# Altium schematic symbol library jlcpcb_2025_04_ferrites_extended_0603.schlib: 833 symbols (part 3 of 4) (continued)
## MMZ1608B301CTDH5
designator FB?  Impedance @ Frequency: 300Ω@100MHz
Ferrite, 300Ω@100MHz, ±25%, 250mΩ, 500mA, SMD 0603; Manufacturer: TDK; Manufacturer Part Number: MMZ1608B301CTDH5; Package Size: 0603; JLCPCB Basic Part: No; JLCPCB Part Number: C433027; Supplier 1: LCSC; Category: Ferrite Beads; Supplier Part Number 1: C433027; Tolerance: ±25%; Rated Current: 500mA; DC Resistance: 250mΩ; RoHS: Yes; ComponentLink1Description: Datasheet; ComponentLink1URL: https://wmsc.lcsc.com/wmsc/upload/file/pdf/v2/lcsc/2304140030_TDK-MMZ1608B301CTDH5_C433027.pdf; ComponentLink2Description: JLCPCB Part URL; ComponentLink2URL: https://jlcpcb.com/partdetail/C433027; ComponentLink3Description: LCSC Part URL; ComponentLink3URL: https://lcsc.com/product-detail/Ferrite-Beads_TDK-TDK-MMZ1608B301CTDH5_C433027.html
footprint FB-0603 (0603 (1608M) Ferrite)
pins: 1, 2

## MMZ1608B471CTAH0
designator FB?  Impedance @ Frequency: 470Ω@100MHz
Ferrite, 470Ω@100MHz, ±25%, 300mΩ, 500mA, SMD 0603; Manufacturer: TDK; Manufacturer Part Number: MMZ1608B471CTAH0; Package Size: 0603; JLCPCB Basic Part: No; JLCPCB Part Number: C2661479; Supplier 1: LCSC; Category: Ferrite Beads; Supplier Part Number 1: C2661479; Tolerance: ±25%; Rated Current: 500mA; DC Resistance: 300mΩ; RoHS: Yes; ComponentLink1Description: Datasheet; ComponentLink1URL: https://wmsc.lcsc.com/wmsc/upload/file/pdf/v2/lcsc/2304140030_TDK-MMZ1608B471CTAH0_C2661479.pdf; ComponentLink2Description: JLCPCB Part URL; ComponentLink2URL: https://jlcpcb.com/partdetail/C2661479; ComponentLink3Description: LCSC Part URL; ComponentLink3URL: https://lcsc.com/product-detail/Ferrite-Beads_TDK-TDK-MMZ1608B471CTAH0_C2661479.html
footprint FB-0603 (0603 (1608M) Ferrite)
pins: 1, 2

## MMZ1608B601CTAH0
designator FB?  Impedance @ Frequency: 600Ω@100MHz
Ferrite, 600Ω@100MHz, ±25%, 400mΩ, 500mA, SMD 0603; Manufacturer: TDK; Manufacturer Part Number: MMZ1608B601CTAH0; Package Size: 0603; JLCPCB Basic Part: No; JLCPCB Part Number: C97120; Supplier 1: LCSC; Category: Ferrite Beads; Supplier Part Number 1: C97120; Tolerance: ±25%; Rated Current: 500mA; DC Resistance: 400mΩ; RoHS: Yes; ComponentLink1Description: Datasheet; ComponentLink1URL: https://wmsc.lcsc.com/wmsc/upload/file/pdf/v2/lcsc/2304140030_TDK-MMZ1608B601CTAH0_C97120.pdf; ComponentLink2Description: JLCPCB Part URL; ComponentLink2URL: https://jlcpcb.com/partdetail/C97120; ComponentLink3Description: LCSC Part URL; ComponentLink3URL: https://lcsc.com/product-detail/Ferrite-Beads_TDK-TDK-MMZ1608B601CTAH0_C97120.html
footprint FB-0603 (0603 (1608M) Ferrite)
pins: 1, 2

## MMZ1608B601CTDH5
designator FB?  Impedance @ Frequency: 600Ω@100MHz
Ferrite, 600Ω@100MHz, ±25%, 400mΩ, 500mA, SMD 0603; Manufacturer: TDK; Manufacturer Part Number: MMZ1608B601CTDH5; Package Size: 0603; JLCPCB Basic Part: No; JLCPCB Part Number: C275437; Supplier 1: LCSC; Category: Ferrite Beads; Supplier Part Number 1: C275437; Tolerance: ±25%; Rated Current: 500mA; DC Resistance: 400mΩ; RoHS: Yes; ComponentLink1Description: Datasheet; ComponentLink1URL: https://wmsc.lcsc.com/wmsc/upload/file/pdf/v2/lcsc/2304140030_TDK-MMZ1608B601CTDH5_C275437.pdf; ComponentLink2Description: JLCPCB Part URL; ComponentLink2URL: https://jlcpcb.com/partdetail/C275437; ComponentLink3Description: LCSC Part URL; ComponentLink3URL: https://lcsc.com/product-detail/Ferrite-Beads_TDK-TDK-MMZ1608B601CTDH5_C275437.html
footprint FB-0603 (0603 (1608M) Ferrite)
pins: 1, 2

## MMZ1608D050CTA00
designator FB?  Impedance @ Frequency: 5Ω@100MHz
Ferrite, 5Ω@100MHz, ±25%, 50mΩ, 700mA, SMD 0603; Manufacturer: TDK; Manufacturer Part Number: MMZ1608D050CTA00; Package Size: 0603; JLCPCB Basic Part: No; JLCPCB Part Number: C307759; Supplier 1: LCSC; Category: Ferrite Beads; Supplier Part Number 1: C307759; Tolerance: ±25%; Rated Current: 700mA; DC Resistance: 50mΩ; RoHS: Yes; ComponentLink1Description: Datasheet; ComponentLink1URL: https://wmsc.lcsc.com/wmsc/upload/file/pdf/v2/lcsc/2304140030_TDK-MMZ1608D050CTA00_C307759.pdf; ComponentLink2Description: JLCPCB Part URL; ComponentLink2URL: https://jlcpcb.com/partdetail/C307759; ComponentLink3Description: LCSC Part URL; ComponentLink3URL: https://lcsc.com/product-detail/Ferrite-Beads_TDK-TDK-MMZ1608D050CTA00_C307759.html
footprint FB-0603 (0603 (1608M) Ferrite)
pins: 1, 2

## MMZ1608D100CTAH0
designator FB?  Impedance @ Frequency: 10Ω@100MHz
Ferrite, 10Ω@100MHz, ±25%, 100mΩ, 500mA, SMD 0603; Manufacturer: TDK; Manufacturer Part Number: MMZ1608D100CTAH0; Package Size: 0603; JLCPCB Basic Part: No; JLCPCB Part Number: C275438; Supplier 1: LCSC; Category: Ferrite Beads; Supplier Part Number 1: C275438; Tolerance: ±25%; Rated Current: 500mA; DC Resistance: 100mΩ; RoHS: Yes; ComponentLink1Description: Datasheet; ComponentLink1URL: https://wmsc.lcsc.com/wmsc/upload/file/pdf/v2/lcsc/2304140030_TDK-MMZ1608D100CTAH0_C275438.pdf; ComponentLink2Description: JLCPCB Part URL; ComponentLink2URL: https://jlcpcb.com/partdetail/C275438; ComponentLink3Description: LCSC Part URL; ComponentLink3URL: https://lcsc.com/product-detail/Ferrite-Beads_TDK-TDK-MMZ1608D100CTAH0_C275438.html
footprint FB-0603 (0603 (1608M) Ferrite)
pins: 1, 2

## MMZ1608D121CTAH0
designator FB?  Impedance @ Frequency: 120Ω@100MHz
Ferrite, 120Ω@100MHz, ±25%, 300mΩ, 400mA, SMD 0603; Manufacturer: TDK; Manufacturer Part Number: MMZ1608D121CTAH0; Package Size: 0603; JLCPCB Basic Part: No; JLCPCB Part Number: C275439; Supplier 1: LCSC; Category: Ferrite Beads; Supplier Part Number 1: C275439; Tolerance: ±25%; Rated Current: 400mA; DC Resistance: 300mΩ; RoHS: Yes; ComponentLink1Description: Datasheet; ComponentLink1URL: https://wmsc.lcsc.com/wmsc/upload/file/pdf/v2/lcsc/2304140030_TDK-MMZ1608D121CTAH0_C275439.pdf; ComponentLink2Description: JLCPCB Part URL; ComponentLink2URL: https://jlcpcb.com/partdetail/C275439; ComponentLink3Description: LCSC Part URL; ComponentLink3URL: https://lcsc.com/product-detail/Ferrite-Beads_TDK-TDK-MMZ1608D121CTAH0_C275439.html
footprint FB-0603 (0603 (1608M) Ferrite)
pins: 1, 2

## MMZ1608D121CTDH5
designator FB?  Impedance @ Frequency: 120Ω@100MHz
Ferrite, 120Ω@100MHz, 300mΩ, SMD 0603; Manufacturer: TDK; Manufacturer Part Number: MMZ1608D121CTDH5; Package Size: 0603; JLCPCB Basic Part: No; JLCPCB Part Number: C3716437; Supplier 1: LCSC; Category: Ferrite Beads; Supplier Part Number 1: C3716437; DC Resistance: 300mΩ; RoHS: Yes; ComponentLink1Description: Datasheet; ComponentLink1URL: https://wmsc.lcsc.com/wmsc/upload/file/pdf/v2/lcsc/2401161238_TDK-MMZ1608D121CTDH5_C3716437.pdf; ComponentLink2Description: JLCPCB Part URL; ComponentLink2URL: https://jlcpcb.com/partdetail/C3716437; ComponentLink3Description: LCSC Part URL; ComponentLink3URL: https://lcsc.com/product-detail/Ferrite-Beads_TDK-TDK-MMZ1608D121CTDH5_C3716437.html
pins: 1, 2

## MMZ1608D241CTD25
designator FB?  Impedance @ Frequency: 240Ω@100MHz
Ferrite, 240Ω@100MHz, ±25%, 600mΩ, 300mA, SMD 0603; Manufacturer: TDK; Manufacturer Part Number: MMZ1608D241CTD25; Package Size: 0603; JLCPCB Basic Part: No; JLCPCB Part Number: C2661641; Supplier 1: LCSC; Category: Ferrite Beads; Supplier Part Number 1: C2661641; Tolerance: ±25%; Rated Current: 300mA; DC Resistance: 600mΩ; RoHS: Yes; ComponentLink1Description: Datasheet; ComponentLink1URL: https://wmsc.lcsc.com/wmsc/upload/file/pdf/v2/lcsc/2304140030_TDK-MMZ1608D241CTD25_C2661641.pdf; ComponentLink2Description: JLCPCB Part URL; ComponentLink2URL: https://jlcpcb.com/partdetail/C2661641; ComponentLink3Description: LCSC Part URL; ComponentLink3URL: https://lcsc.com/product-detail/Ferrite-Beads_TDK-TDK-MMZ1608D241CTD25_C2661641.html
footprint FB-0603 (0603 (1608M) Ferrite)
pins: 1, 2

## MMZ1608D301BTA00
designator FB?  Impedance @ Frequency: 300Ω@100MHz
Ferrite, 300Ω@100MHz, ±25%, 700mΩ, 300mA, SMD 0603; Manufacturer: TDK; Manufacturer Part Number: MMZ1608D301BTA00; Package Size: 0603; JLCPCB Basic Part: No; JLCPCB Part Number: C136264; Supplier 1: LCSC; Category: Ferrite Beads; Supplier Part Number 1: C136264; Tolerance: ±25%; Rated Current: 300mA; DC Resistance: 700mΩ; RoHS: Yes; ComponentLink1Description: Datasheet; ComponentLink1URL: https://wmsc.lcsc.com/wmsc/upload/file/pdf/v2/lcsc/2304140030_TDK-MMZ1608D301BTA00_C136264.pdf; ComponentLink2Description: JLCPCB Part URL; ComponentLink2URL: https://jlcpcb.com/partdetail/C136264; ComponentLink3Description: LCSC Part URL; ComponentLink3URL: https://lcsc.com/product-detail/Ferrite-Beads_TDK-TDK-MMZ1608D301BTA00_C136264.html
footprint FB-0603 (0603 (1608M) Ferrite)
pins: 1, 2

## MMZ1608D301BTD25
designator FB?  Impedance @ Frequency: 300Ω@100MHz
Ferrite, 300Ω@100MHz, ±25%, 700mΩ, 300mA, SMD 0603; Manufacturer: TDK; Manufacturer Part Number: MMZ1608D301BTD25; Package Size: 0603; JLCPCB Basic Part: No; JLCPCB Part Number: C2661880; Supplier 1: LCSC; Category: Ferrite Beads; Supplier Part Number 1: C2661880; Tolerance: ±25%; Rated Current: 300mA; DC Resistance: 700mΩ; RoHS: Yes; ComponentLink1Description: Datasheet; ComponentLink1URL: https://wmsc.lcsc.com/wmsc/upload/file/pdf/v2/lcsc/2304140030_TDK-MMZ1608D301BTD25_C2661880.pdf; ComponentLink2Description: JLCPCB Part URL; ComponentLink2URL: https://jlcpcb.com/partdetail/C2661880; ComponentLink3Description: LCSC Part URL; ComponentLink3URL: https://lcsc.com/product-detail/Ferrite-Beads_TDK-TDK-MMZ1608D301BTD25_C2661880.html
footprint FB-0603 (0603 (1608M) Ferrite)
pins: 1, 2

## MMZ1608D500CTAH0
designator FB?  Impedance @ Frequency: 50Ω@100MHz
Ferrite, 50Ω@100MHz, ±25%, 250mΩ, 500mA, SMD 0603; Manufacturer: TDK; Manufacturer Part Number: MMZ1608D500CTAH0; Package Size: 0603; JLCPCB Basic Part: No; JLCPCB Part Number: C76808; Supplier 1: LCSC; Category: Ferrite Beads; Supplier Part Number 1: C76808; Tolerance: ±25%; Rated Current: 500mA; DC Resistance: 250mΩ; RoHS: Yes; ComponentLink1Description: Datasheet; ComponentLink1URL: https://wmsc.lcsc.com/wmsc/upload/file/pdf/v2/lcsc/2304140030_TDK-MMZ1608D500CTAH0_C76808.pdf; ComponentLink2Description: JLCPCB Part URL; ComponentLink2URL: https://jlcpcb.com/partdetail/C76808; ComponentLink3Description: LCSC Part URL; ComponentLink3URL: https://lcsc.com/product-detail/Ferrite-Beads_TDK-TDK-MMZ1608D500CTAH0_C76808.html
footprint FB-0603 (0603 (1608M) Ferrite)
pins: 1, 2

## MMZ1608D800CTAH0
designator FB?  Impedance @ Frequency: 80Ω@100MHz
Ferrite, 80Ω@100MHz, ±25%, 300mΩ, 500mA, SMD 0603; Manufacturer: TDK; Manufacturer Part Number: MMZ1608D800CTAH0; Package Size: 0603; JLCPCB Basic Part: No; JLCPCB Part Number: C275442; Supplier 1: LCSC; Category: Ferrite Beads; Supplier Part Number 1: C275442; Tolerance: ±25%; Rated Current: 500mA; DC Resistance: 300mΩ; RoHS: Yes; ComponentLink1Description: Datasheet; ComponentLink1URL: https://wmsc.lcsc.com/wmsc/upload/file/pdf/v2/lcsc/2304140030_TDK-MMZ1608D800CTAH0_C275442.pdf; ComponentLink2Description: JLCPCB Part URL; ComponentLink2URL: https://jlcpcb.com/partdetail/C275442; ComponentLink3Description: LCSC Part URL; ComponentLink3URL: https://lcsc.com/product-detail/Ferrite-Beads_TDK-TDK-MMZ1608D800CTAH0_C275442.html
footprint FB-0603 (0603 (1608M) Ferrite)
pins: 1, 2

## MMZ1608Q102BTA00
designator FB?  Impedance @ Frequency: 1kΩ@100MHz
Ferrite, 1kΩ@100MHz, ±25%, 1Ω, 200mA, SMD 0603; Manufacturer: TDK; Manufacturer Part Number: MMZ1608Q102BTA00; Package Size: 0603; JLCPCB Basic Part: No; JLCPCB Part Number: C433028; Supplier 1: LCSC; Category: Ferrite Beads; Supplier Part Number 1: C433028; Tolerance: ±25%; Rated Current: 200mA; DC Resistance: 1Ω; RoHS: Yes; ComponentLink1Description: Datasheet; ComponentLink1URL: https://wmsc.lcsc.com/wmsc/upload/file/pdf/v2/lcsc/2304140030_TDK-MMZ1608Q102BTA00_C433028.pdf; ComponentLink2Description: JLCPCB Part URL; ComponentLink2URL: https://jlcpcb.com/partdetail/C433028; ComponentLink3Description: LCSC Part URL; ComponentLink3URL: https://lcsc.com/product-detail/Ferrite-Beads_TDK-TDK-MMZ1608Q102BTA00_C433028.html
footprint FB-0603 (0603 (1608M) Ferrite)
pins: 1, 2

## MMZ1608Q102BTD25
designator FB?  Impedance @ Frequency: 1kΩ@100MHz
Ferrite, 1kΩ@100MHz, ±25%, 1Ω, 200mA, SMD 0603; Manufacturer: TDK; Manufacturer Part Number: MMZ1608Q102BTD25; Package Size: 0603; JLCPCB Basic Part: No; JLCPCB Part Number: C2661547; Supplier 1: LCSC; Category: Ferrite Beads; Supplier Part Number 1: C2661547; Tolerance: ±25%; Rated Current: 200mA; DC Resistance: 1Ω; RoHS: Yes; ComponentLink1Description: Datasheet; ComponentLink1URL: https://wmsc.lcsc.com/wmsc/upload/file/pdf/v2/lcsc/2304140030_TDK-MMZ1608Q102BTD25_C2661547.pdf; ComponentLink2Description: JLCPCB Part URL; ComponentLink2URL: https://jlcpcb.com/partdetail/C2661547; ComponentLink3Description: LCSC Part URL; ComponentLink3URL: https://lcsc.com/product-detail/Ferrite-Beads_TDK-TDK-MMZ1608Q102BTD25_C2661547.html
footprint FB-0603 (0603 (1608M) Ferrite)
pins: 1, 2

## MMZ1608Q121BTA00
designator FB?  Impedance @ Frequency: 120Ω@100MHz
Ferrite, 120Ω@100MHz, 300mΩ, SMD 0603; Manufacturer: TDK; Manufacturer Part Number: MMZ1608Q121BTA00; Package Size: 0603; JLCPCB Basic Part: No; JLCPCB Part Number: C695168; Supplier 1: LCSC; Category: Ferrite Beads; Supplier Part Number 1: C695168; DC Resistance: 300mΩ; RoHS: Yes; ComponentLink1Description: Datasheet; ComponentLink1URL: https://wmsc.lcsc.com/wmsc/upload/file/pdf/v2/lcsc/2008101534_TDK-MMZ1608Q121BTA00_C695168.pdf; ComponentLink2Description: JLCPCB Part URL; ComponentLink2URL: https://jlcpcb.com/partdetail/C695168; ComponentLink3Description: LCSC Part URL; ComponentLink3URL: https://lcsc.com/product-detail/Ferrite-Beads_TDK-TDK-MMZ1608Q121BTA00_C695168.html
pins: 1, 2

## MMZ1608Q601BTA00
designator FB?  Impedance @ Frequency: 600Ω@100MHz
Ferrite, 600Ω@100MHz, ±25%, 800mΩ, 200mA, SMD 0603; Manufacturer: TDK; Manufacturer Part Number: MMZ1608Q601BTA00; Package Size: 0603; JLCPCB Basic Part: No; JLCPCB Part Number: C307760; Supplier 1: LCSC; Category: Ferrite Beads; Supplier Part Number 1: C307760; Tolerance: ±25%; Rated Current: 200mA; DC Resistance: 800mΩ; RoHS: Yes; ComponentLink1Description: Datasheet; ComponentLink1URL: https://wmsc.lcsc.com/wmsc/upload/file/pdf/v2/lcsc/1811131650_TDK-MMZ1608Q601BTA00_C307760.pdf; ComponentLink2Description: JLCPCB Part URL; ComponentLink2URL: https://jlcpcb.com/partdetail/C307760; ComponentLink3Description: LCSC Part URL; ComponentLink3URL: https://lcsc.com/product-detail/Ferrite-Beads_TDK-TDK-MMZ1608Q601BTA00_C307760.html
footprint FB-0603 (0603 (1608M) Ferrite)
pins: 1, 2

## MMZ1608R102ATA00
designator FB?  Impedance @ Frequency: 1kΩ@100MHz
Ferrite, 1kΩ@100MHz, ±25%, 500mΩ, 400mA, SMD 0603; Manufacturer: TDK; Manufacturer Part Number: MMZ1608R102ATA00; Package Size: 0603; JLCPCB Basic Part: No; JLCPCB Part Number: C89445; Supplier 1: LCSC; Category: Ferrite Beads; Supplier Part Number 1: C89445; Tolerance: ±25%; Rated Current: 400mA; DC Resistance: 500mΩ; RoHS: Yes; ComponentLink1Description: Datasheet; ComponentLink1URL: https://wmsc.lcsc.com/wmsc/upload/file/pdf/v2/lcsc/2304140030_TDK-MMZ1608R102ATA00_C89445.pdf; ComponentLink2Description: JLCPCB Part URL; ComponentLink2URL: https://jlcpcb.com/partdetail/C89445; ComponentLink3Description: LCSC Part URL; ComponentLink3URL: https://lcsc.com/product-detail/Ferrite-Beads_TDK-TDK-MMZ1608R102ATA00_C89445.html
footprint FB-0603 (0603 (1608M) Ferrite)
pins: 1, 2

## MMZ1608R102ATD25
designator FB?  Impedance @ Frequency: 1kΩ@100MHz
Ferrite, 1kΩ@100MHz, ±25%, 500mΩ, 400mA, SMD 0603; Manufacturer: TDK; Manufacturer Part Number: MMZ1608R102ATD25; Package Size: 0603; JLCPCB Basic Part: No; JLCPCB Part Number: C307761; Supplier 1: LCSC; Category: Ferrite Beads; Supplier Part Number 1: C307761; Tolerance: ±25%; Rated Current: 400mA; DC Resistance: 500mΩ; RoHS: Yes; ComponentLink1Description: Datasheet; ComponentLink1URL: https://wmsc.lcsc.com/wmsc/upload/file/pdf/v2/lcsc/2304140030_TDK-MMZ1608R102ATD25_C307761.pdf; ComponentLink2Description: JLCPCB Part URL; ComponentLink2URL: https://jlcpcb.com/partdetail/C307761; ComponentLink3Description: LCSC Part URL; ComponentLink3URL: https://lcsc.com/product-detail/Ferrite-Beads_TDK-TDK-MMZ1608R102ATD25_C307761.html
footprint FB-0603 (0603 (1608M) Ferrite)
pins: 1, 2

## MMZ1608R121ATA00
designator FB?  Impedance @ Frequency: 120Ω@100MHz
Ferrite, 120Ω@100MHz, ±25%, 180mΩ, 500mA, SMD 0603; Manufacturer: TDK; Manufacturer Part Number: MMZ1608R121ATA00; Package Size: 0603; JLCPCB Basic Part: No; JLCPCB Part Number: C136490; Supplier 1: LCSC; Category: Ferrite Beads; Supplier Part Number 1: C136490; Tolerance: ±25%; Rated Current: 500mA; DC Resistance: 180mΩ; RoHS: Yes; ComponentLink1Description: Datasheet; ComponentLink1URL: https://wmsc.lcsc.com/wmsc/upload/file/pdf/v2/lcsc/2304140030_TDK-MMZ1608R121ATA00_C136490.pdf; ComponentLink2Description: JLCPCB Part URL; ComponentLink2URL: https://jlcpcb.com/partdetail/C136490; ComponentLink3Description: LCSC Part URL; ComponentLink3URL: https://lcsc.com/product-detail/Ferrite-Beads_TDK-TDK-MMZ1608R121ATA00_C136490.html
footprint FB-0603 (0603 (1608M) Ferrite)
pins: 1, 2

## MMZ1608R150ATA00
designator FB?  Impedance @ Frequency: 15Ω@100MHz
Ferrite, 15Ω@100MHz, ±25%, 50mΩ, 1.5A, SMD 0603; Manufacturer: TDK; Manufacturer Part Number: MMZ1608R150ATA00; Package Size: 0603; JLCPCB Basic Part: No; JLCPCB Part Number: C275445; Supplier 1: LCSC; Category: Ferrite Beads; Supplier Part Number 1: C275445; Tolerance: ±25%; Rated Current: 1.5A; DC Resistance: 50mΩ; RoHS: Yes; ComponentLink1Description: Datasheet; ComponentLink1URL: https://wmsc.lcsc.com/wmsc/upload/file/pdf/v2/lcsc/2304140030_TDK-MMZ1608R150ATA00_C275445.pdf; ComponentLink2Description: JLCPCB Part URL; ComponentLink2URL: https://jlcpcb.com/partdetail/C275445; ComponentLink3Description: LCSC Part URL; ComponentLink3URL: https://lcsc.com/product-detail/Ferrite-Beads_TDK-TDK-MMZ1608R150ATA00_C275445.html
footprint FB-0603 (0603 (1608M) Ferrite)
pins: 1, 2

## MMZ1608R300ATA00
designator FB?  Impedance @ Frequency: 30Ω@100MHz
Ferrite, 30Ω@100MHz, ±25%, 50mΩ, 1.5A, SMD 0603; Manufacturer: TDK; Manufacturer Part Number: MMZ1608R300ATA00; Package Size: 0603; JLCPCB Basic Part: No; JLCPCB Part Number: C136263; Supplier 1: LCSC; Category: Ferrite Beads; Supplier Part Number 1: C136263; Tolerance: ±25%; Rated Current: 1.5A; DC Resistance: 50mΩ; RoHS: Yes; ComponentLink1Description: Datasheet; ComponentLink1URL: https://wmsc.lcsc.com/wmsc/upload/file/pdf/v2/lcsc/2304140030_TDK-MMZ1608R300ATA00_C136263.pdf; ComponentLink2Description: JLCPCB Part URL; ComponentLink2URL: https://jlcpcb.com/partdetail/C136263; ComponentLink3Description: LCSC Part URL; ComponentLink3URL: https://lcsc.com/product-detail/Ferrite-Beads_TDK-TDK-MMZ1608R300ATA00_C136263.html
footprint FB-0603 (0603 (1608M) Ferrite)
pins: 1, 2

## MMZ1608R300ATD25
designator FB?  Impedance @ Frequency: 30Ω@100MHz
Ferrite, 30Ω@100MHz, ±25%, 50mΩ, 1.5A, SMD 0603; Manufacturer: TDK; Manufacturer Part Number: MMZ1608R300ATD25; Package Size: 0603; JLCPCB Basic Part: No; JLCPCB Part Number: C2683173; Supplier 1: LCSC; Category: Ferrite Beads; Supplier Part Number 1: C2683173; Tolerance: ±25%; Rated Current: 1.5A; DC Resistance: 50mΩ; RoHS: Yes; ComponentLink1Description: Datasheet; ComponentLink1URL: https://wmsc.lcsc.com/wmsc/upload/file/pdf/v2/lcsc/2106070404_TDK-MMZ1608R300ATD25_C2683173.pdf; ComponentLink2Description: JLCPCB Part URL; ComponentLink2URL: https://jlcpcb.com/partdetail/C2683173; ComponentLink3Description: LCSC Part URL; ComponentLink3URL: https://lcsc.com/product-detail/Ferrite-Beads_TDK-TDK-MMZ1608R300ATD25_C2683173.html
footprint FB-0603 (0603 (1608M) Ferrite)
pins: 1, 2

## MMZ1608R301ATA00
designator FB?  Impedance @ Frequency: 300Ω@100MHz
Ferrite, 300Ω@100MHz, ±25%, 250mΩ, 500mA, SMD 0603; Manufacturer: TDK; Manufacturer Part Number: MMZ1608R301ATA00; Package Size: 0603; JLCPCB Basic Part: No; JLCPCB Part Number: C136225; Supplier 1: LCSC; Category: Ferrite Beads; Supplier Part Number 1: C136225; Tolerance: ±25%; Rated Current: 500mA; DC Resistance: 250mΩ; RoHS: Yes; ComponentLink1Description: Datasheet; ComponentLink1URL: https://wmsc.lcsc.com/wmsc/upload/file/pdf/v2/lcsc/2304140030_TDK-MMZ1608R301ATA00_C136225.pdf; ComponentLink2Description: JLCPCB Part URL; ComponentLink2URL: https://jlcpcb.com/partdetail/C136225; ComponentLink3Description: LCSC Part URL; ComponentLink3URL: https://lcsc.com/product-detail/Ferrite-Beads_TDK-TDK-MMZ1608R301ATA00_C136225.html
footprint FB-0603 (0603 (1608M) Ferrite)
pins: 1, 2

## MMZ1608R301CTAH0
designator FB?  Impedance @ Frequency: 300Ω@100MHz
Ferrite, 300Ω@100MHz, ±25%, 250mΩ, 500mA, SMD 0603; Manufacturer: TDK; Manufacturer Part Number: MMZ1608R301CTAH0; Package Size: 0603; JLCPCB Basic Part: No; JLCPCB Part Number: C275446; Supplier 1: LCSC; Category: Ferrite Beads; Supplier Part Number 1: C275446; Tolerance: ±25%; Rated Current: 500mA; DC Resistance: 250mΩ; RoHS: Yes; ComponentLink1Description: Datasheet; ComponentLink1URL: https://wmsc.lcsc.com/wmsc/upload/file/pdf/v2/lcsc/2304140030_TDK-MMZ1608R301CTAH0_C275446.pdf; ComponentLink2Description: JLCPCB Part URL; ComponentLink2URL: https://jlcpcb.com/partdetail/C275446; ComponentLink3Description: LCSC Part URL; ComponentLink3URL: https://lcsc.com/product-detail/Ferrite-Beads_TDK-TDK-MMZ1608R301CTAH0_C275446.html
footprint FB-0603 (0603 (1608M) Ferrite)
pins: 1, 2

## MMZ1608R471ATA00
designator FB?  Impedance @ Frequency: 470Ω@100MHz
Ferrite, 470Ω@100MHz, ±25%, 300mΩ, 500mA, SMD 0603; Manufacturer: TDK; Manufacturer Part Number: MMZ1608R471ATA00; Package Size: 0603; JLCPCB Basic Part: No; JLCPCB Part Number: C524455; Supplier 1: LCSC; Category: Ferrite Beads; Supplier Part Number 1: C524455; Tolerance: ±25%; Rated Current: 500mA; DC Resistance: 300mΩ; RoHS: Yes; ComponentLink1Description: Datasheet; ComponentLink1URL: https://wmsc.lcsc.com/wmsc/upload/file/pdf/v2/lcsc/2304140030_TDK-MMZ1608R471ATA00_C524455.pdf; ComponentLink2Description: JLCPCB Part URL; ComponentLink2URL: https://jlcpcb.com/partdetail/C524455; ComponentLink3Description: LCSC Part URL; ComponentLink3URL: https://lcsc.com/product-detail/Ferrite-Beads_TDK-TDK-MMZ1608R471ATA00_C524455.html
footprint FB-0603 (0603 (1608M) Ferrite)
pins: 1, 2

## MMZ1608R600ATA00
designator FB?  Impedance @ Frequency: 60Ω@100MHz
Ferrite, 60Ω@100MHz, ±25%, 100mΩ, 800mA, SMD 0603; Manufacturer: TDK; Manufacturer Part Number: MMZ1608R600ATA00; Package Size: 0603; JLCPCB Basic Part: No; JLCPCB Part Number: C275447; Supplier 1: LCSC; Category: Ferrite Beads; Supplier Part Number 1: C275447; Tolerance: ±25%; Rated Current: 800mA; DC Resistance: 100mΩ; RoHS: Yes; ComponentLink1Description: Datasheet; ComponentLink1URL: https://wmsc.lcsc.com/wmsc/upload/file/pdf/v2/lcsc/2304140030_TDK-MMZ1608R600ATA00_C275447.pdf; ComponentLink2Description: JLCPCB Part URL; ComponentLink2URL: https://jlcpcb.com/partdetail/C275447; ComponentLink3Description: LCSC Part URL; ComponentLink3URL: https://lcsc.com/product-detail/Ferrite-Beads_TDK-TDK-MMZ1608R600ATA00_C275447.html
footprint FB-0603 (0603 (1608M) Ferrite)
pins: 1, 2

## MMZ1608R600ATD25
designator FB?  Impedance @ Frequency: 60Ω@100MHz
Ferrite, 60Ω@100MHz, 100mΩ, 800mA, SMD 0603; Manufacturer: TDK; Manufacturer Part Number: MMZ1608R600ATD25; Package Size: 0603; JLCPCB Basic Part: No; JLCPCB Part Number: C307762; Supplier 1: LCSC; Category: Ferrite Beads; Supplier Part Number 1: C307762; Rated Current: 800mA; DC Resistance: 100mΩ; RoHS: Yes; ComponentLink1Description: Datasheet; ComponentLink1URL: https://wmsc.lcsc.com/wmsc/upload/file/pdf/v2/lcsc/2401161221_TDK-MMZ1608R600ATD25_C307762.pdf; ComponentLink2Description: JLCPCB Part URL; ComponentLink2URL: https://jlcpcb.com/partdetail/C307762; ComponentLink3Description: LCSC Part URL; ComponentLink3URL: https://lcsc.com/product-detail/Ferrite-Beads_TDK-TDK-MMZ1608R600ATD25_C307762.html
pins: 1, 2

## MMZ1608R601ATA00
designator FB?  Impedance @ Frequency: 600Ω@100MHz
Ferrite, 600Ω@100MHz, ±25%, 400mΩ, 500mA, SMD 0603; Manufacturer: TDK; Manufacturer Part Number: MMZ1608R601ATA00; Package Size: 0603; JLCPCB Basic Part: No; JLCPCB Part Number: C107326; Supplier 1: LCSC; Category: Ferrite Beads; Supplier Part Number 1: C107326; Tolerance: ±25%; Rated Current: 500mA; DC Resistance: 400mΩ; RoHS: Yes; ComponentLink1Description: Datasheet; ComponentLink1URL: https://wmsc.lcsc.com/wmsc/upload/file/pdf/v2/lcsc/2304140030_TDK-MMZ1608R601ATA00_C107326.pdf; ComponentLink2Description: JLCPCB Part URL; ComponentLink2URL: https://jlcpcb.com/partdetail/C107326; ComponentLink3Description: LCSC Part URL; ComponentLink3URL: https://lcsc.com/product-detail/Ferrite-Beads_TDK-TDK-MMZ1608R601ATA00_C107326.html
footprint FB-0603 (0603 (1608M) Ferrite)
pins: 1, 2

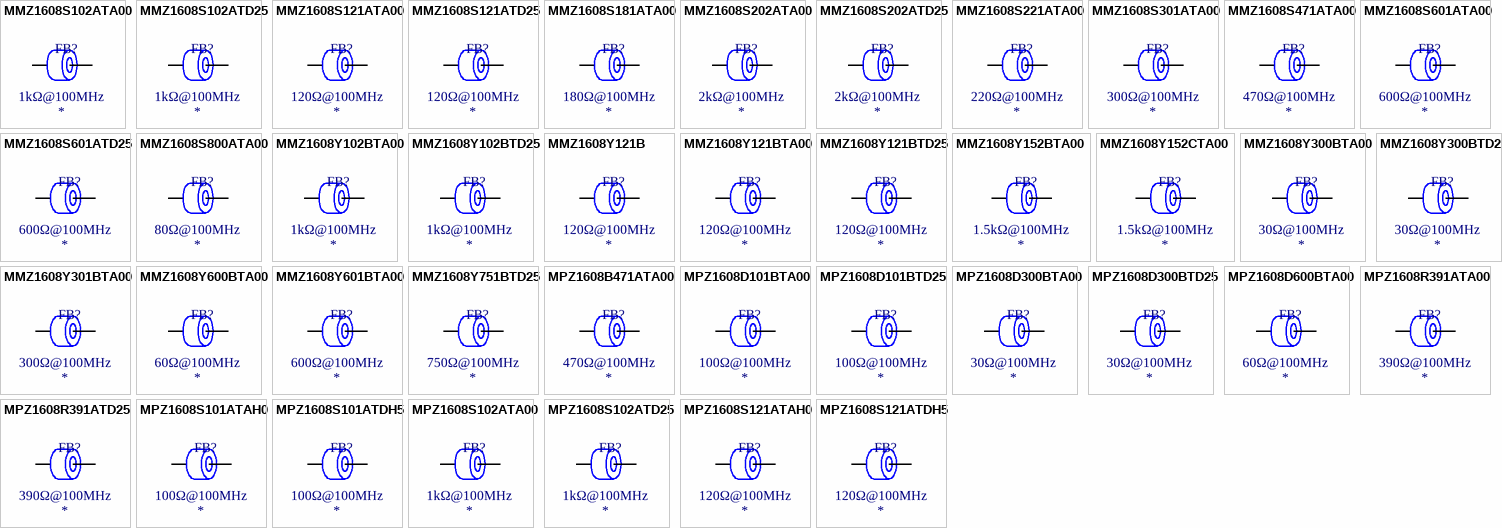
[diagram p15: symbols MMZ1608S102ATA00 to MPZ1608S121ATDH5]

## MMZ1608S102ATA00
designator FB?  Impedance @ Frequency: 1kΩ@100MHz
Ferrite, 1kΩ@100MHz, ±25%, 500mΩ, 400mA, SMD 0603; Manufacturer: TDK; Manufacturer Part Number: MMZ1608S102ATA00; Package Size: 0603; JLCPCB Basic Part: No; JLCPCB Part Number: C275448; Supplier 1: LCSC; Category: Ferrite Beads; Supplier Part Number 1: C275448; Tolerance: ±25%; Rated Current: 400mA; DC Resistance: 500mΩ; RoHS: Yes; ComponentLink1Description: Datasheet; ComponentLink1URL: https://wmsc.lcsc.com/wmsc/upload/file/pdf/v2/lcsc/2304140030_TDK-MMZ1608S102ATA00_C275448.pdf; ComponentLink2Description: JLCPCB Part URL; ComponentLink2URL: https://jlcpcb.com/partdetail/C275448; ComponentLink3Description: LCSC Part URL; ComponentLink3URL: https://lcsc.com/product-detail/Ferrite-Beads_TDK-TDK-MMZ1608S102ATA00_C275448.html
footprint FB-0603 (0603 (1608M) Ferrite)
pins: 1, 2

## MMZ1608S102ATD25
designator FB?  Impedance @ Frequency: 1kΩ@100MHz
Ferrite, 1kΩ@100MHz, 500mΩ, 400mA, SMD 0603; Manufacturer: TDK; Manufacturer Part Number: MMZ1608S102ATD25; Package Size: 0603; JLCPCB Basic Part: No; JLCPCB Part Number: C307763; Supplier 1: LCSC; Category: Ferrite Beads; Supplier Part Number 1: C307763; Rated Current: 400mA; DC Resistance: 500mΩ; RoHS: Yes; ComponentLink1Description: Datasheet; ComponentLink1URL: https://wmsc.lcsc.com/wmsc/upload/file/pdf/v2/lcsc/2401161221_TDK-MMZ1608S102ATD25_C307763.pdf; ComponentLink2Description: JLCPCB Part URL; ComponentLink2URL: https://jlcpcb.com/partdetail/C307763; ComponentLink3Description: LCSC Part URL; ComponentLink3URL: https://lcsc.com/product-detail/Ferrite-Beads_TDK-TDK-MMZ1608S102ATD25_C307763.html
pins: 1, 2

## MMZ1608S121ATA00
designator FB?  Impedance @ Frequency: 120Ω@100MHz
Ferrite, 120Ω@100MHz, ±25%, 200mΩ, 500mA, SMD 0603; Manufacturer: TDK; Manufacturer Part Number: MMZ1608S121ATA00; Package Size: 0603; JLCPCB Basic Part: No; JLCPCB Part Number: C136223; Supplier 1: LCSC; Category: Ferrite Beads; Supplier Part Number 1: C136223; Tolerance: ±25%; Rated Current: 500mA; DC Resistance: 200mΩ; RoHS: Yes; ComponentLink1Description: Datasheet; ComponentLink1URL: https://wmsc.lcsc.com/wmsc/upload/file/pdf/v2/lcsc/2304140030_TDK-MMZ1608S121ATA00_C136223.pdf; ComponentLink2Description: JLCPCB Part URL; ComponentLink2URL: https://jlcpcb.com/partdetail/C136223; ComponentLink3Description: LCSC Part URL; ComponentLink3URL: https://lcsc.com/product-detail/Ferrite-Beads_TDK-TDK-MMZ1608S121ATA00_C136223.html
footprint FB-0603 (0603 (1608M) Ferrite)
pins: 1, 2

## MMZ1608S121ATD25
designator FB?  Impedance @ Frequency: 120Ω@100MHz
Ferrite, 120Ω@100MHz, ±25%, 150mΩ, 500mA, SMD 0603; Manufacturer: TDK; Manufacturer Part Number: MMZ1608S121ATD25; Package Size: 0603; JLCPCB Basic Part: No; JLCPCB Part Number: C2661467; Supplier 1: LCSC; Category: Ferrite Beads; Supplier Part Number 1: C2661467; Tolerance: ±25%; Rated Current: 500mA; DC Resistance: 150mΩ; RoHS: Yes; ComponentLink1Description: Datasheet; ComponentLink1URL: https://wmsc.lcsc.com/wmsc/upload/file/pdf/v2/lcsc/2304140030_TDK-MMZ1608S121ATD25_C2661467.pdf; ComponentLink2Description: JLCPCB Part URL; ComponentLink2URL: https://jlcpcb.com/partdetail/C2661467; ComponentLink3Description: LCSC Part URL; ComponentLink3URL: https://lcsc.com/product-detail/Ferrite-Beads_TDK-TDK-MMZ1608S121ATD25_C2661467.html
footprint FB-0603 (0603 (1608M) Ferrite)
pins: 1, 2

## MMZ1608S181ATA00
designator FB?  Impedance @ Frequency: 180Ω@100MHz
Ferrite, 180Ω@100MHz, ±25%, 200mΩ, 500mA, SMD 0603; Manufacturer: TDK; Manufacturer Part Number: MMZ1608S181ATA00; Package Size: 0603; JLCPCB Basic Part: No; JLCPCB Part Number: C94265; Supplier 1: LCSC; Category: Ferrite Beads; Supplier Part Number 1: C94265; Tolerance: ±25%; Rated Current: 500mA; DC Resistance: 200mΩ; RoHS: Yes; ComponentLink1Description: Datasheet; ComponentLink1URL: https://wmsc.lcsc.com/wmsc/upload/file/pdf/v2/lcsc/2304140030_TDK-MMZ1608S181ATA00_C94265.pdf; ComponentLink2Description: JLCPCB Part URL; ComponentLink2URL: https://jlcpcb.com/partdetail/C94265; ComponentLink3Description: LCSC Part URL; ComponentLink3URL: https://lcsc.com/product-detail/Ferrite-Beads_TDK-TDK-MMZ1608S181ATA00_C94265.html
footprint FB-0603 (0603 (1608M) Ferrite)
pins: 1, 2

## MMZ1608S202ATA00
designator FB?  Impedance @ Frequency: 2kΩ@100MHz
Ferrite, 2kΩ@100MHz, ±25%, 500mΩ, 400mA, SMD 0603; Manufacturer: TDK; Manufacturer Part Number: MMZ1608S202ATA00; Package Size: 0603; JLCPCB Basic Part: No; JLCPCB Part Number: C275449; Supplier 1: LCSC; Category: Ferrite Beads; Supplier Part Number 1: C275449; Tolerance: ±25%; Rated Current: 400mA; DC Resistance: 500mΩ; RoHS: Yes; ComponentLink1Description: Datasheet; ComponentLink1URL: https://wmsc.lcsc.com/wmsc/upload/file/pdf/v2/lcsc/2304140030_TDK-MMZ1608S202ATA00_C275449.pdf; ComponentLink2Description: JLCPCB Part URL; ComponentLink2URL: https://jlcpcb.com/partdetail/C275449; ComponentLink3Description: LCSC Part URL; ComponentLink3URL: https://lcsc.com/product-detail/Ferrite-Beads_TDK-TDK-MMZ1608S202ATA00_C275449.html
footprint FB-0603 (0603 (1608M) Ferrite)
pins: 1, 2

## MMZ1608S202ATD25
designator FB?  Impedance @ Frequency: 2kΩ@100MHz
Ferrite, 2kΩ@100MHz, 900mΩ, 200mA, SMD 0603; Manufacturer: TDK; Manufacturer Part Number: MMZ1608S202ATD25; Package Size: 0603; JLCPCB Basic Part: No; JLCPCB Part Number: C307764; Supplier 1: LCSC; Category: Ferrite Beads; Supplier Part Number 1: C307764; Rated Current: 200mA; DC Resistance: 900mΩ; RoHS: Yes; ComponentLink1Description: Datasheet; ComponentLink1URL: https://wmsc.lcsc.com/wmsc/upload/file/pdf/v2/lcsc/2401161221_TDK-MMZ1608S202ATD25_C307764.pdf; ComponentLink2Description: JLCPCB Part URL; ComponentLink2URL: https://jlcpcb.com/partdetail/C307764; ComponentLink3Description: LCSC Part URL; ComponentLink3URL: https://lcsc.com/product-detail/Ferrite-Beads_TDK-TDK-MMZ1608S202ATD25_C307764.html
pins: 1, 2

## MMZ1608S221ATA00
designator FB?  Impedance @ Frequency: 220Ω@100MHz
Ferrite, 220Ω@100MHz, ±25%, 200mΩ, 500mA, SMD 0603; Manufacturer: TDK; Manufacturer Part Number: MMZ1608S221ATA00; Package Size: 0603; JLCPCB Basic Part: No; JLCPCB Part Number: C531442; Supplier 1: LCSC; Category: Ferrite Beads; Supplier Part Number 1: C531442; Tolerance: ±25%; Rated Current: 500mA; DC Resistance: 200mΩ; RoHS: Yes; ComponentLink1Description: Datasheet; ComponentLink1URL: https://wmsc.lcsc.com/wmsc/upload/file/pdf/v2/lcsc/2304140030_TDK-MMZ1608S221ATA00_C531442.pdf; ComponentLink2Description: JLCPCB Part URL; ComponentLink2URL: https://jlcpcb.com/partdetail/C531442; ComponentLink3Description: LCSC Part URL; ComponentLink3URL: https://lcsc.com/product-detail/Ferrite-Beads_TDK-TDK-MMZ1608S221ATA00_C531442.html
footprint FB-0603 (0603 (1608M) Ferrite)
pins: 1, 2

## MMZ1608S301ATA00
designator FB?  Impedance @ Frequency: 300Ω@100MHz
Ferrite, 300Ω@100MHz, ±25%, 300mΩ, 500mA, SMD 0603; Manufacturer: TDK; Manufacturer Part Number: MMZ1608S301ATA00; Package Size: 0603; JLCPCB Basic Part: No; JLCPCB Part Number: C136224; Supplier 1: LCSC; Category: Ferrite Beads; Supplier Part Number 1: C136224; Tolerance: ±25%; Rated Current: 500mA; DC Resistance: 300mΩ; RoHS: Yes; ComponentLink1Description: Datasheet; ComponentLink1URL: https://wmsc.lcsc.com/wmsc/upload/file/pdf/v2/lcsc/2304140030_TDK-MMZ1608S301ATA00_C136224.pdf; ComponentLink2Description: JLCPCB Part URL; ComponentLink2URL: https://jlcpcb.com/partdetail/C136224; ComponentLink3Description: LCSC Part URL; ComponentLink3URL: https://lcsc.com/product-detail/Ferrite-Beads_TDK-TDK-MMZ1608S301ATA00_C136224.html
footprint FB-0603 (0603 (1608M) Ferrite)
pins: 1, 2

## MMZ1608S471ATA00
designator FB?  Impedance @ Frequency: 470Ω@100MHz
Ferrite, 470Ω@100MHz, ±25%, 300mΩ, 500mA, SMD 0603; Manufacturer: TDK; Manufacturer Part Number: MMZ1608S471ATA00; Package Size: 0603; JLCPCB Basic Part: No; JLCPCB Part Number: C531444; Supplier 1: LCSC; Category: Ferrite Beads; Supplier Part Number 1: C531444; Tolerance: ±25%; Rated Current: 500mA; DC Resistance: 300mΩ; RoHS: Yes; ComponentLink1Description: Datasheet; ComponentLink1URL: https://wmsc.lcsc.com/wmsc/upload/file/pdf/v2/lcsc/2304140030_TDK-MMZ1608S471ATA00_C531444.pdf; ComponentLink2Description: JLCPCB Part URL; ComponentLink2URL: https://jlcpcb.com/partdetail/C531444; ComponentLink3Description: LCSC Part URL; ComponentLink3URL: https://lcsc.com/product-detail/Ferrite-Beads_TDK-TDK-MMZ1608S471ATA00_C531444.html
footprint FB-0603 (0603 (1608M) Ferrite)
pins: 1, 2

## MMZ1608S601ATA00
designator FB?  Impedance @ Frequency: 600Ω@100MHz
Ferrite, 600Ω@100MHz, ±25%, 350mΩ, 500mA, SMD 0603; Manufacturer: TDK; Manufacturer Part Number: MMZ1608S601ATA00; Package Size: 0603; JLCPCB Basic Part: No; JLCPCB Part Number: C275451; Supplier 1: LCSC; Category: Ferrite Beads; Supplier Part Number 1: C275451; Tolerance: ±25%; Rated Current: 500mA; DC Resistance: 350mΩ; RoHS: Yes; ComponentLink1Description: Datasheet; ComponentLink1URL: https://wmsc.lcsc.com/wmsc/upload/file/pdf/v2/lcsc/2304140030_TDK-MMZ1608S601ATA00_C275451.pdf; ComponentLink2Description: JLCPCB Part URL; ComponentLink2URL: https://jlcpcb.com/partdetail/C275451; ComponentLink3Description: LCSC Part URL; ComponentLink3URL: https://lcsc.com/product-detail/Ferrite-Beads_TDK-TDK-MMZ1608S601ATA00_C275451.html
footprint FB-0603 (0603 (1608M) Ferrite)
pins: 1, 2

## MMZ1608S601ATD25
designator FB?  Impedance @ Frequency: 600Ω@100MHz
Ferrite, 600Ω@100MHz, ±25%, 350mΩ, 500mA, SMD 0603; Manufacturer: TDK; Manufacturer Part Number: MMZ1608S601ATD25; Package Size: 0603; JLCPCB Basic Part: No; JLCPCB Part Number: C433031; Supplier 1: LCSC; Category: Ferrite Beads; Supplier Part Number 1: C433031; Tolerance: ±25%; Rated Current: 500mA; DC Resistance: 350mΩ; RoHS: Yes; ComponentLink1Description: Datasheet; ComponentLink1URL: https://wmsc.lcsc.com/wmsc/upload/file/pdf/v2/lcsc/2304140030_TDK-MMZ1608S601ATD25_C433031.pdf; ComponentLink2Description: JLCPCB Part URL; ComponentLink2URL: https://jlcpcb.com/partdetail/C433031; ComponentLink3Description: LCSC Part URL; ComponentLink3URL: https://lcsc.com/product-detail/Ferrite-Beads_TDK-TDK-MMZ1608S601ATD25_C433031.html
footprint FB-0603 (0603 (1608M) Ferrite)
pins: 1, 2

## MMZ1608S800ATA00
designator FB?  Impedance @ Frequency: 80Ω@100MHz
Ferrite, 80Ω@100MHz, ±25%, 150mΩ, 500mA, SMD 0603; Manufacturer: TDK; Manufacturer Part Number: MMZ1608S800ATA00; Package Size: 0603; JLCPCB Basic Part: No; JLCPCB Part Number: C107328; Supplier 1: LCSC; Category: Ferrite Beads; Supplier Part Number 1: C107328; Tolerance: ±25%; Rated Current: 500mA; DC Resistance: 150mΩ; RoHS: Yes; ComponentLink1Description: Datasheet; ComponentLink1URL: https://wmsc.lcsc.com/wmsc/upload/file/pdf/v2/lcsc/2304140030_TDK-MMZ1608S800ATA00_C107328.pdf; ComponentLink2Description: JLCPCB Part URL; ComponentLink2URL: https://jlcpcb.com/partdetail/C107328; ComponentLink3Description: LCSC Part URL; ComponentLink3URL: https://lcsc.com/product-detail/Ferrite-Beads_TDK-TDK-MMZ1608S800ATA00_C107328.html
footprint FB-0603 (0603 (1608M) Ferrite)
pins: 1, 2

## MMZ1608Y102BTA00
designator FB?  Impedance @ Frequency: 1kΩ@100MHz
Ferrite, 1kΩ@100MHz, ±25%, 500mΩ, 400mA, SMD 0603; Manufacturer: TDK; Manufacturer Part Number: MMZ1608Y102BTA00; Package Size: 0603; JLCPCB Basic Part: No; JLCPCB Part Number: C114771; Supplier 1: LCSC; Category: Ferrite Beads; Supplier Part Number 1: C114771; Tolerance: ±25%; Rated Current: 400mA; DC Resistance: 500mΩ; RoHS: Yes; ComponentLink1Description: Datasheet; ComponentLink1URL: https://wmsc.lcsc.com/wmsc/upload/file/pdf/v2/lcsc/2304140030_TDK-MMZ1608Y102BTA00_C114771.pdf; ComponentLink2Description: JLCPCB Part URL; ComponentLink2URL: https://jlcpcb.com/partdetail/C114771; ComponentLink3Description: LCSC Part URL; ComponentLink3URL: https://lcsc.com/product-detail/Ferrite-Beads_TDK-TDK-MMZ1608Y102BTA00_C114771.html
footprint FB-0603 (0603 (1608M) Ferrite)
pins: 1, 2

## MMZ1608Y102BTD25
designator FB?  Impedance @ Frequency: 1kΩ@100MHz
Ferrite, 1kΩ@100MHz, ±25%, 500mΩ, 400mA, SMD 0603; Manufacturer: TDK; Manufacturer Part Number: MMZ1608Y102BTD25; Package Size: 0603; JLCPCB Basic Part: No; JLCPCB Part Number: C531293; Supplier 1: LCSC; Category: Ferrite Beads; Supplier Part Number 1: C531293; Tolerance: ±25%; Rated Current: 400mA; DC Resistance: 500mΩ; RoHS: Yes; ComponentLink1Description: Datasheet; ComponentLink1URL: https://wmsc.lcsc.com/wmsc/upload/file/pdf/v2/lcsc/2006191008_TDK-MMZ1608Y102BTD25_C531293.pdf; ComponentLink2Description: JLCPCB Part URL; ComponentLink2URL: https://jlcpcb.com/partdetail/C531293; ComponentLink3Description: LCSC Part URL; ComponentLink3URL: https://lcsc.com/product-detail/Ferrite-Beads_TDK-TDK-MMZ1608Y102BTD25_C531293.html
footprint FB-0603 (0603 (1608M) Ferrite)
pins: 1, 2

## MMZ1608Y121B
designator FB?  Impedance @ Frequency: 120Ω@100MHz
Ferrite, 120Ω@100MHz, ±25%, 200mΩ, 500mA, SMD 0603; Manufacturer: TDK; Manufacturer Part Number: MMZ1608Y121B; Package Size: 0603; JLCPCB Basic Part: No; JLCPCB Part Number: C107329; Supplier 1: LCSC; Category: Ferrite Beads; Supplier Part Number 1: C107329; Tolerance: ±25%; Rated Current: 500mA; DC Resistance: 200mΩ; RoHS: Yes; ComponentLink1Description: Datasheet; ComponentLink1URL: https://wmsc.lcsc.com/wmsc/upload/file/pdf/v2/lcsc/2304140030_TDK-MMZ1608Y121B_C107329.pdf; ComponentLink2Description: JLCPCB Part URL; ComponentLink2URL: https://jlcpcb.com/partdetail/C107329; ComponentLink3Description: LCSC Part URL; ComponentLink3URL: https://lcsc.com/product-detail/Ferrite-Beads_TDK-TDK-MMZ1608Y121B_C107329.html
footprint FB-0603 (0603 (1608M) Ferrite)
pins: 1, 2

## MMZ1608Y121BTA00
designator FB?  Impedance @ Frequency: 120Ω@100MHz
Ferrite, 120Ω@100MHz, ±25%, 200mΩ, 500mA, SMD 0603; Manufacturer: TDK; Manufacturer Part Number: MMZ1608Y121BTA00; Package Size: 0603; JLCPCB Basic Part: No; JLCPCB Part Number: C275452; Supplier 1: LCSC; Category: Ferrite Beads; Supplier Part Number 1: C275452; Tolerance: ±25%; Rated Current: 500mA; DC Resistance: 200mΩ; RoHS: Yes; ComponentLink1Description: Datasheet; ComponentLink1URL: https://wmsc.lcsc.com/wmsc/upload/file/pdf/v2/lcsc/2304140030_TDK-MMZ1608Y121BTA00_C275452.pdf; ComponentLink2Description: JLCPCB Part URL; ComponentLink2URL: https://jlcpcb.com/partdetail/C275452; ComponentLink3Description: LCSC Part URL; ComponentLink3URL: https://lcsc.com/product-detail/Ferrite-Beads_TDK-TDK-MMZ1608Y121BTA00_C275452.html
footprint FB-0603 (0603 (1608M) Ferrite)
pins: 1, 2

## MMZ1608Y121BTD25
designator FB?  Impedance @ Frequency: 120Ω@100MHz
Ferrite, 120Ω@100MHz, ±25%, 200mΩ, 500mA, SMD 0603; Manufacturer: TDK; Manufacturer Part Number: MMZ1608Y121BTD25; Package Size: 0603; JLCPCB Basic Part: No; JLCPCB Part Number: C2661555; Supplier 1: LCSC; Category: Ferrite Beads; Supplier Part Number 1: C2661555; Tolerance: ±25%; Rated Current: 500mA; DC Resistance: 200mΩ; RoHS: Yes; ComponentLink1Description: Datasheet; ComponentLink1URL: https://wmsc.lcsc.com/wmsc/upload/file/pdf/v2/lcsc/2304140030_TDK-MMZ1608Y121BTD25_C2661555.pdf; ComponentLink2Description: JLCPCB Part URL; ComponentLink2URL: https://jlcpcb.com/partdetail/C2661555; ComponentLink3Description: LCSC Part URL; ComponentLink3URL: https://lcsc.com/product-detail/Ferrite-Beads_TDK-TDK-MMZ1608Y121BTD25_C2661555.html
footprint FB-0603 (0603 (1608M) Ferrite)
pins: 1, 2

## MMZ1608Y152BTA00
designator FB?  Impedance @ Frequency: 1.5kΩ@100MHz
Ferrite, 1.5kΩ@100MHz, ±25%, 600mΩ, 300mA, SMD 0603; Manufacturer: TDK; Manufacturer Part Number: MMZ1608Y152BTA00; Package Size: 0603; JLCPCB Basic Part: No; JLCPCB Part Number: C275454; Supplier 1: LCSC; Category: Ferrite Beads; Supplier Part Number 1: C275454; Tolerance: ±25%; Rated Current: 300mA; DC Resistance: 600mΩ; RoHS: Yes; ComponentLink1Description: Datasheet; ComponentLink1URL: https://wmsc.lcsc.com/wmsc/upload/file/pdf/v2/lcsc/1811131643_TDK-MMZ1608Y152BTA00_C275454.pdf; ComponentLink2Description: JLCPCB Part URL; ComponentLink2URL: https://jlcpcb.com/partdetail/C275454; ComponentLink3Description: LCSC Part URL; ComponentLink3URL: https://lcsc.com/product-detail/Ferrite-Beads_TDK-TDK-MMZ1608Y152BTA00_C275454.html
footprint FB-0603 (0603 (1608M) Ferrite)
pins: 1, 2

## MMZ1608Y152CTA00
designator FB?  Impedance @ Frequency: 1.5kΩ@100MHz
Ferrite, 1.5kΩ@100MHz, ±25%, 500mΩ, 300mA, SMD 0603; Manufacturer: TDK; Manufacturer Part Number: MMZ1608Y152CTA00; Package Size: 0603; JLCPCB Basic Part: No; JLCPCB Part Number: C275455; Supplier 1: LCSC; Category: Ferrite Beads; Supplier Part Number 1: C275455; Tolerance: ±25%; Rated Current: 300mA; DC Resistance: 500mΩ; RoHS: Yes; ComponentLink1Description: Datasheet; ComponentLink1URL: https://wmsc.lcsc.com/wmsc/upload/file/pdf/v2/lcsc/2304140030_TDK-MMZ1608Y152CTA00_C275455.pdf; ComponentLink2Description: JLCPCB Part URL; ComponentLink2URL: https://jlcpcb.com/partdetail/C275455; ComponentLink3Description: LCSC Part URL; ComponentLink3URL: https://lcsc.com/product-detail/Ferrite-Beads_TDK-TDK-MMZ1608Y152CTA00_C275455.html
footprint FB-0603 (0603 (1608M) Ferrite)
pins: 1, 2

## MMZ1608Y300BTA00
designator FB?  Impedance @ Frequency: 30Ω@100MHz
Ferrite, 30Ω@100MHz, ±25%, 50mΩ, 1.5A, SMD 0603; Manufacturer: TDK; Manufacturer Part Number: MMZ1608Y300BTA00; Package Size: 0603; JLCPCB Basic Part: No; JLCPCB Part Number: C275456; Supplier 1: LCSC; Category: Ferrite Beads; Supplier Part Number 1: C275456; Tolerance: ±25%; Rated Current: 1.5A; DC Resistance: 50mΩ; RoHS: Yes; ComponentLink1Description: Datasheet; ComponentLink1URL: https://wmsc.lcsc.com/wmsc/upload/file/pdf/v2/lcsc/2304140030_TDK-MMZ1608Y300BTA00_C275456.pdf; ComponentLink2Description: JLCPCB Part URL; ComponentLink2URL: https://jlcpcb.com/partdetail/C275456; ComponentLink3Description: LCSC Part URL; ComponentLink3URL: https://lcsc.com/product-detail/Ferrite-Beads_TDK-TDK-MMZ1608Y300BTA00_C275456.html
footprint FB-0603 (0603 (1608M) Ferrite)
pins: 1, 2

## MMZ1608Y300BTD25
designator FB?  Impedance @ Frequency: 30Ω@100MHz
Ferrite, 30Ω@100MHz, ±25%, 50mΩ, 1.5A, SMD 0603; Manufacturer: TDK; Manufacturer Part Number: MMZ1608Y300BTD25; Package Size: 0603; JLCPCB Basic Part: No; JLCPCB Part Number: C433032; Supplier 1: LCSC; Category: Ferrite Beads; Supplier Part Number 1: C433032; Tolerance: ±25%; Rated Current: 1.5A; DC Resistance: 50mΩ; RoHS: Yes; ComponentLink1Description: Datasheet; ComponentLink1URL: https://wmsc.lcsc.com/wmsc/upload/file/pdf/v2/lcsc/2304140030_TDK-MMZ1608Y300BTD25_C433032.pdf; ComponentLink2Description: JLCPCB Part URL; ComponentLink2URL: https://jlcpcb.com/partdetail/C433032; ComponentLink3Description: LCSC Part URL; ComponentLink3URL: https://lcsc.com/product-detail/Ferrite-Beads_TDK-TDK-MMZ1608Y300BTD25_C433032.html
footprint FB-0603 (0603 (1608M) Ferrite)
pins: 1, 2

## MMZ1608Y301BTA00
designator FB?  Impedance @ Frequency: 300Ω@100MHz
Ferrite, 300Ω@100MHz, ±25%, 300mΩ, 500mA, SMD 0603; Manufacturer: TDK; Manufacturer Part Number: MMZ1608Y301BTA00; Package Size: 0603; JLCPCB Basic Part: No; JLCPCB Part Number: C275457; Supplier 1: LCSC; Category: Ferrite Beads; Supplier Part Number 1: C275457; Tolerance: ±25%; Rated Current: 500mA; DC Resistance: 300mΩ; RoHS: Yes; ComponentLink1Description: Datasheet; ComponentLink1URL: https://wmsc.lcsc.com/wmsc/upload/file/pdf/v2/lcsc/2304140030_TDK-MMZ1608Y301BTA00_C275457.pdf; ComponentLink2Description: JLCPCB Part URL; ComponentLink2URL: https://jlcpcb.com/partdetail/C275457; ComponentLink3Description: LCSC Part URL; ComponentLink3URL: https://lcsc.com/product-detail/Ferrite-Beads_TDK-TDK-MMZ1608Y301BTA00_C275457.html
footprint FB-0603 (0603 (1608M) Ferrite)
pins: 1, 2

## MMZ1608Y600BTA00
designator FB?  Impedance @ Frequency: 60Ω@100MHz
Ferrite, 60Ω@100MHz, ±25%, 150mΩ, 500mA, SMD 0603; Manufacturer: TDK; Manufacturer Part Number: MMZ1608Y600BTA00; Package Size: 0603; JLCPCB Basic Part: No; JLCPCB Part Number: C87553; Supplier 1: LCSC; Category: Ferrite Beads; Supplier Part Number 1: C87553; Tolerance: ±25%; Rated Current: 500mA; DC Resistance: 150mΩ; RoHS: Yes; ComponentLink1Description: Datasheet; ComponentLink1URL: https://wmsc.lcsc.com/wmsc/upload/file/pdf/v2/lcsc/2304140030_TDK-MMZ1608Y600BTA00_C87553.pdf; ComponentLink2Description: JLCPCB Part URL; ComponentLink2URL: https://jlcpcb.com/partdetail/C87553; ComponentLink3Description: LCSC Part URL; ComponentLink3URL: https://lcsc.com/product-detail/Ferrite-Beads_TDK-TDK-MMZ1608Y600BTA00_C87553.html
footprint FB-0603 (0603 (1608M) Ferrite)
pins: 1, 2

## MMZ1608Y601BTA00
designator FB?  Impedance @ Frequency: 600Ω@100MHz
Ferrite, 600Ω@100MHz, ±25%, 400mΩ, 500mA, SMD 0603; Manufacturer: TDK; Manufacturer Part Number: MMZ1608Y601BTA00; Package Size: 0603; JLCPCB Basic Part: No; JLCPCB Part Number: C136491; Supplier 1: LCSC; Category: Ferrite Beads; Supplier Part Number 1: C136491; Tolerance: ±25%; Rated Current: 500mA; DC Resistance: 400mΩ; RoHS: Yes; ComponentLink1Description: Datasheet; ComponentLink1URL: https://wmsc.lcsc.com/wmsc/upload/file/pdf/v2/lcsc/1811131641_TDK-MMZ1608Y601BTA00_C136491.pdf; ComponentLink2Description: JLCPCB Part URL; ComponentLink2URL: https://jlcpcb.com/partdetail/C136491; ComponentLink3Description: LCSC Part URL; ComponentLink3URL: https://lcsc.com/product-detail/Ferrite-Beads_TDK-TDK-MMZ1608Y601BTA00_C136491.html
footprint FB-0603 (0603 (1608M) Ferrite)
pins: 1, 2

## MMZ1608Y751BTD25
designator FB?  Impedance @ Frequency: 750Ω@100MHz
Ferrite, 750Ω@100MHz, 450mΩ, SMD 0603; Manufacturer: TDK; Manufacturer Part Number: MMZ1608Y751BTD25; Package Size: 0603; JLCPCB Basic Part: No; JLCPCB Part Number: C3716942; Supplier 1: LCSC; Category: Ferrite Beads; Supplier Part Number 1: C3716942; DC Resistance: 450mΩ; RoHS: Yes; ComponentLink1Description: Datasheet; ComponentLink1URL: https://wmsc.lcsc.com/wmsc/upload/file/pdf/v2/lcsc/2401161242_TDK-MMZ1608Y751BTD25_C3716942.pdf; ComponentLink2Description: JLCPCB Part URL; ComponentLink2URL: https://jlcpcb.com/partdetail/C3716942; ComponentLink3Description: LCSC Part URL; ComponentLink3URL: https://lcsc.com/product-detail/Ferrite-Beads_TDK-TDK-MMZ1608Y751BTD25_C3716942.html
pins: 1, 2

## MPZ1608B471ATA00
designator FB?  Impedance @ Frequency: 470Ω@100MHz
Ferrite, 470Ω@100MHz, ±25%, 150mΩ, 1A, SMD 0603; Manufacturer: TDK; Manufacturer Part Number: MPZ1608B471ATA00; Package Size: 0603; JLCPCB Basic Part: No; JLCPCB Part Number: C114780; Supplier 1: LCSC; Category: Ferrite Beads; Supplier Part Number 1: C114780; Tolerance: ±25%; Rated Current: 1A; DC Resistance: 150mΩ; RoHS: Yes; ComponentLink1Description: Datasheet; ComponentLink1URL: https://wmsc.lcsc.com/wmsc/upload/file/pdf/v2/lcsc/1811131653_TDK-MPZ1608B471ATA00_C114780.pdf; ComponentLink2Description: JLCPCB Part URL; ComponentLink2URL: https://jlcpcb.com/partdetail/C114780; ComponentLink3Description: LCSC Part URL; ComponentLink3URL: https://lcsc.com/product-detail/Ferrite-Beads_TDK-TDK-MPZ1608B471ATA00_C114780.html
footprint FB-0603 (0603 (1608M) Ferrite)
pins: 1, 2